# Altium footprint library klp.PcbLib: 436 footprints (part 17 of 28)
Each footprint in its own frame and in the unit in brackets; x right, y up, seen from the top. Pads: shape width x height; smd on the part's side, far side on the other; paste and mask are expansions set on the pad; w line width, h text height; cw(c..) or ccw(c..) is an arc to the next point about the centre after c.
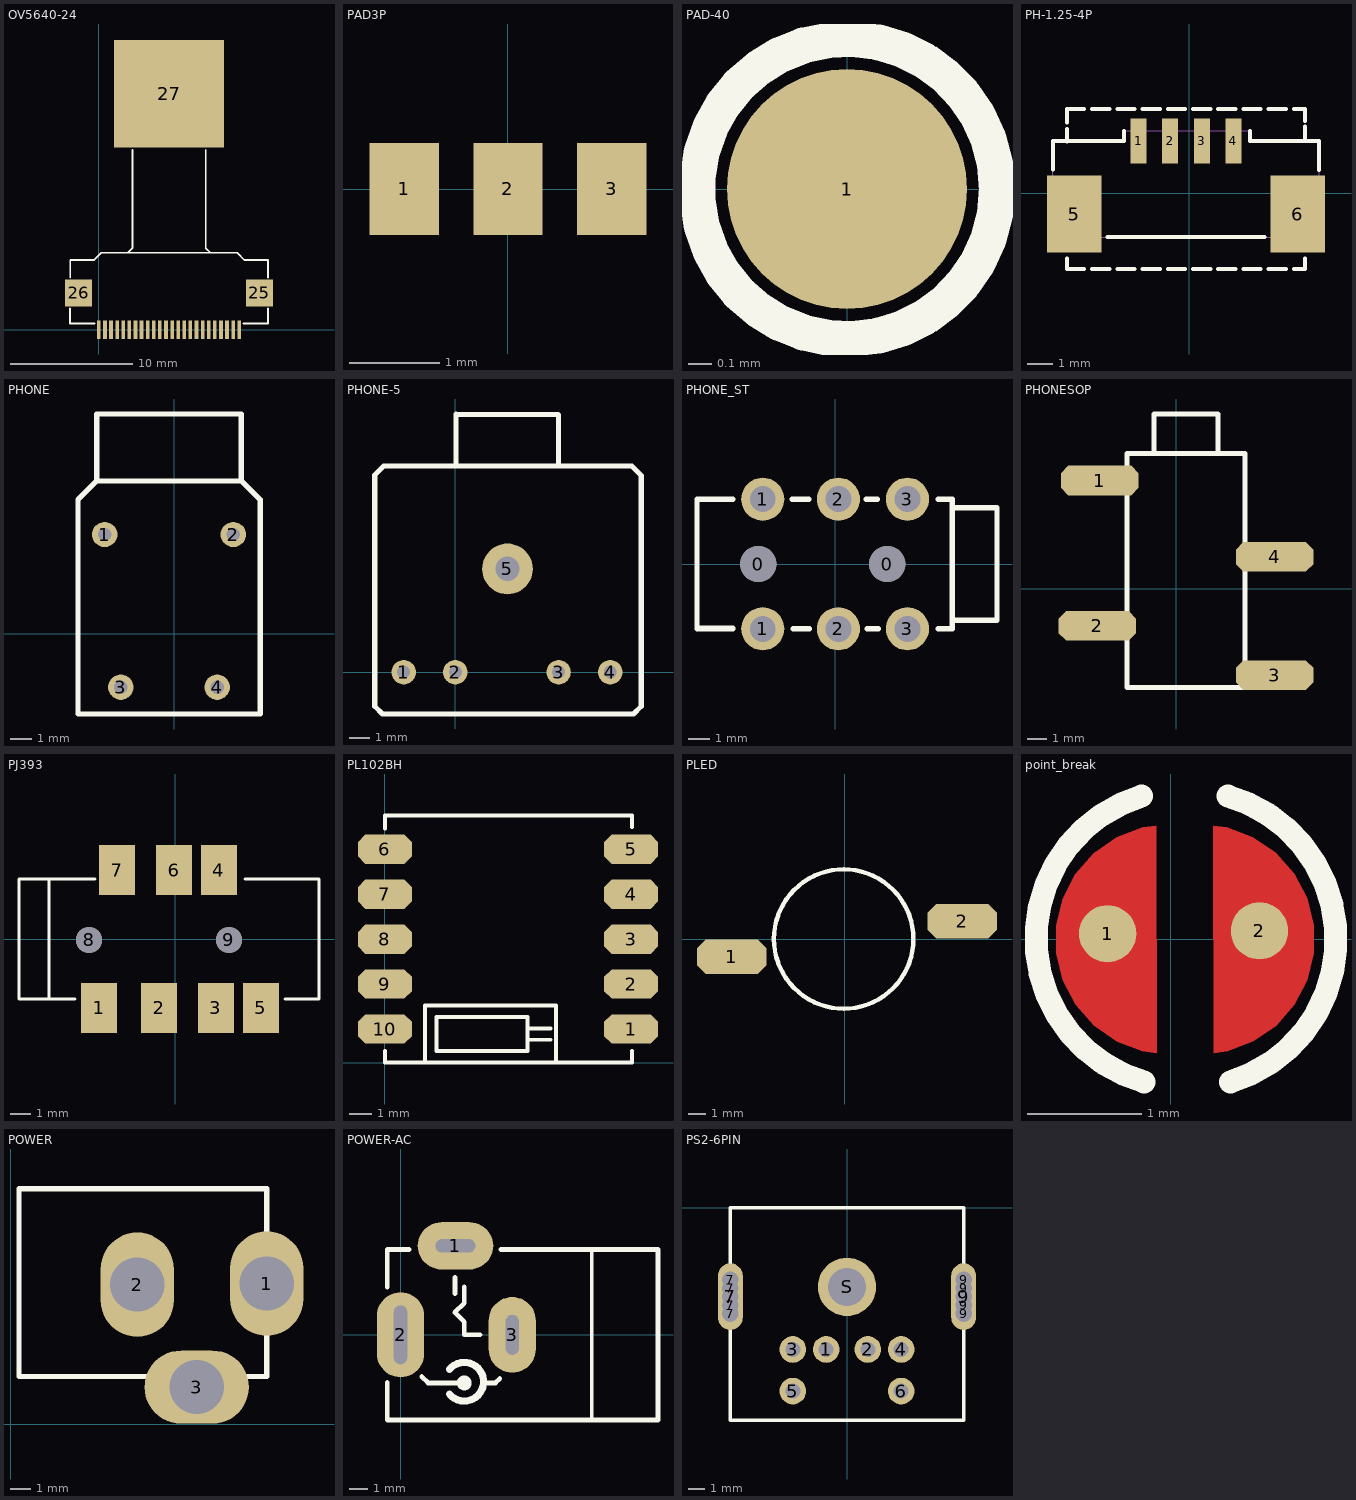
[diagram p16: the footprints below, top view; thin cyan lines are the x and y axes]

## OV5640-24 [mm]
pads (27):
  rect 0.3x1.5 smd: 1(0,0) 2(0.5,0) 3(1,0) 4(1.5,0) 5(2,0) 6(2.5,0) 7(3,0) 8(3.5,0) 9(4,0) 10(4.5,0) 11(5,0) 12(5.5,0) 13(6,0) 14(6.5,0) 15(7,0) 16(7.5,0) 17(8,0) 18(8.5,0) 19(9,0) 20(9.5,0) 21(10,0) 22(10.5,0) 23(11,0) 24(11.5,0)
  rect 2.2x2.2 smd: 25(13.151,3.023) 26(-1.657,3.023)
  rect 9x8.8 smd: 27(5.753,19.317)
Top Overlay:
  lines w0.152: -2.356,1.753 -2.356,0.508 -0.336,0.508 ; -2.343,4.293 -2.343,5.708 ; -2.325,5.708 -0.432,5.708 -0.413,5.708 0.187,6.308 ; 0.33,6.308 0.187,6.308 ; 2.159,6.308 2.371,6.308 2.753,6.69 2.753,14.732 ; 8.753,14.732 8.753,13.424 8.753,6.724 8.753,6.699 9.144,6.308 ; 9.186,6.308 9.271,6.308 ; 11.83,0.508 13.85,0.508 13.85,1.753 ; 13.85,4.293 13.85,5.708 ; 13.85,5.715 13.843,5.708 11.93,5.708 11.33,6.308 0.187,6.308

## PAD3P [mil]
pads (3):
  rect 30x40 smd: 1(-45,0) 2(0,0) 3(45,0)

## PAD-40 [mil]
pads (1):
  round 40 smd paste-43.31: 1(0,0)
Top Overlay:
  circle w6: c0,0 r25

## PCBComponent_1 [mm]

## PH-1.25-4P [mil]
pads (6):
  rect 25x70 smd mask+3: 1(-78.82,82) 2(-29.61,82) 3(19.61,82) 4(68.82,82)
  rect 85x120 smd mask+3: 5(-179.21,-32.17) 6(169.21,-32.17)
Top Overlay:
  lines w6: -212.67,37 -212.67,82 -101.57,82 -101.57,98 ; -191.02,-101.17 -191.02,-118 -163.77,-118 ; -191.02,80.97 -191.02,100.89 ; -191.02,110.58 -191.02,132 -163.77,132 ; -151.65,-118 -124.4,-118 ; -151.65,132 -124.4,132 ; -127.71,-68 117.71,-68 ; -112.28,-118 -85.03,-118 ; -112.28,132 -85.03,132 ; -72.91,-118 -45.66,-118 ; -72.91,132 -45.66,132 ; -33.54,-118 -6.29,-118 ; -33.54,132 -6.29,132 ; 5.83,-118 33.08,-118 ; 5.83,132 33.08,132 ; 45.2,-118 72.45,-118 ; 45.2,132 72.45,132 ; 84.57,-118 111.82,-118 ; 84.57,132 111.82,132 ; 95,98 95,82 202.67,82 202.67,36.83 ; 123.94,-118 151.19,-118 ; 123.94,132 151.19,132 ; 163.31,-118 180.38,-118 ; 163.31,132 180.38,132 ; 181.02,-118 181.02,-101.17 ; 181.02,82 181.02,104.43 ; 181.02,113.2 181.02,132
Mechanical 16:
  lines w1: -212.67,-68 -212.67,82 -101.57,82 -101.57,98 95,98 95,82 202.67,82 202.67,-68 -212.67,-68

## PHONE [mm]
height 0.6
pads (4):
  round 1.2 hole 0.635: 1(-3.302,4.699) 2(2.794,4.699) 3(-2.54,-2.54) 4(2.032,-2.54)
Top Overlay:
  lines w0.254: -3.683,7.239 -3.683,10.414 -0.127,10.414 3.175,10.414 3.175,7.239 ; -3.683,7.239 -4.572,6.35 -4.572,-3.81 4.064,-3.81 4.064,6.35 3.175,7.239 ; -3.683,7.239 3.175,7.239

## PHONE-5 [mm] "PHONE_5"
height 5
pads (5):
  round 1.2 hole 0.635: 1(-2.54,0) 2(0,0) 3(5.08,0) 4(7.62,0)
  round 2.5 hole 1.2: 5(2.565,5.08)
Top Overlay:
  lines w0.254: 0.025,10.135 0.025,12.7 0.051,12.675 5.055,12.675 5.08,12.649 5.08,10.135 ; -3.962,-1.676 -3.581,-2.057 8.763,-2.057 9.144,-1.676 9.144,9.677 8.687,10.135 2.565,10.135 -3.531,10.135 -3.962,9.703 -3.962,-1.676

## PHONE_ST [mm] "PHONE_ST"
height 9
pads (8):
  round 1.676 hole 1.676: 0(-3.556,0) 0(2.413,0)
  round 2 hole 1.2: 1(-3.35,-3) 1(-3.35,3) 2(0.15,-3) 2(0.15,3) 3(3.35,-3) 3(3.35,3)
Top Overlay:
  lines w0.254: -6.393,-2.969 -4.742,-2.969 ; -4.742,-3.007 -6.393,-3.007 -6.393,3 -4.742,3 ; -1.986,3 -1.224,3 ; -1.948,-3.007 -1.186,-3.007 ; 1.443,3 1.951,3 ; 1.481,-3.007 1.989,-3.007 ; 4.783,-3.007 5.33,-3.007 ; 4.783,3 5.418,3 5.418,-3.007 ; 5.418,-2.6 7.493,-2.6 7.493,2.6 5.418,2.6

## PHONESOP [mil]
height 196.85
pads (4):
  oct 157.48x60 smd: 1(-155,220) 2(-160,-75) 3(200,-175) 4(200,65)
Top Overlay:
  lines w10: -45,275 -45,355 85,355 85,275 ; -100,-200 140,-200 140,275 -100,275 -100,-200

## PJ393 [mm]
pads (9):
  rect 1.8x2.5 smd: 1(-3.8,-3.45) 2(-0.8,-3.45) 3(2.05,-3.45) 4(2.2,3.45) 5(4.3,-3.45) 6(-0.05,3.45) 7(-2.9,3.45)
  round 1.3 hole 1.3 unplated: 8(-4.3,-0.05) 9(2.7,-0.05)
Top Overlay:
  lines w0.152: -6.3,-3 -6.3,3 ; -5,-3 -7.8,-3 -7.8,3 -4,3 ; 3.5,3 7.2,3 7.2,-3 5.5,-3

## PL102BH [mm] "PL102BH-2.0"
height 1
pads (10):
  oct 2.4x1.3 smd: 1(10.952,1.492) 2(10.952,3.492) 3(10.952,5.492) 4(10.952,7.492) 5(10.952,9.492) 6(0,9.492) 7(0,7.492) 8(0,5.492) 9(0,3.492) 10(0,1.492)
Top Overlay:
  lines w0.178: 0,0.508 0,0 11,0 11,0.508 ; 0,10.414 0,11 11,11 11,10.492 ; 1.778,0 1.778,2.54 7.62,2.54 7.62,0 ; 6.35,1.016 7.366,1.016 ; 6.35,1.524 7.366,1.524 ; 2.286,0.508 2.286,2.032 6.35,2.032 6.35,0.508 2.286,0.508

## PLED [mm] "POWER LED"
height 5
pads (2):
  oct 4x2 smd: 1(-6.477,-1.016) 2(6.731,1.016)
Top Overlay:
  circle w0.254: c-0.063,0 r4

## point_break [mm]
pads (2):
  round 0.5 smd: 1(-0.55,0.05) 2(0.775,0.075)
Top Layer:
  region: -0.121,-0.992 -0.241,-0.978 -0.468,-0.892 -0.668,-0.754 -0.829,-0.572 -0.942,-0.358 -1,-0.122 -1,0.12 -0.943,0.356 -0.83,0.571 -0.67,0.753 -0.471,0.891 -0.244,0.978 -0.124,0.993
  region: 0.371,0.993 0.491,0.978 0.718,0.892 0.918,0.754 1.079,0.573 1.192,0.358 1.25,0.123 1.25,-0.12 1.193,-0.355 1.08,-0.57 0.92,-0.752 0.721,-0.891 0.494,-0.977 0.374,-0.992
Top Overlay:
  lines w0.2: -0.256,1.25 ccw(c0.125,0.007) -0.232,-1.243 ; 0.5,1.25 cw(c0.143,0) 0.523,-1.243
Top Solder:
  region: -0.121,-0.992 -0.241,-0.978 -0.468,-0.892 -0.668,-0.754 -0.829,-0.572 -0.942,-0.358 -1,-0.122 -1,0.12 -0.943,0.356 -0.83,0.571 -0.67,0.753 -0.471,0.891 -0.244,0.978 -0.124,0.993
  region: 0.371,0.993 0.491,0.978 0.718,0.892 0.918,0.754 1.079,0.573 1.192,0.358 1.25,0.123 1.25,-0.12 1.193,-0.355 1.08,-0.57 0.92,-0.752 0.721,-0.891 0.494,-0.977 0.374,-0.992

## POWER [mil] "DC_IN"
height 472.44
pads (3):
  oval 138x197 hole 102: 1(482.32,265.16) 2(238.32,263.16)
  oval 197x138 hole 102: 3(350.32,70.16)
Top Overlay:
  lines w10: 482.32,90.16 15.32,90.16 15.32,444.16 482.32,444.16 482.32,92.16

## POWER-AC [mm]
pads (3):
  oval 4x2.5 hole 0.7 slot 2.1 at 0 deg: 1(2.9,4.7)
  oval 2.5x4.5 hole 0.7 slot 3.1 at 90 deg: 2(0,0)
  oval 2.5x4 hole 0.7 slot 2.1 at 90 deg: 3(5.9,0)
Top Overlay:
  circle w0.381: c3.36,-2.54 r0.203
  lines w0.203: 10.1,-4.5 10.1,4.5
  lines w0.254: -0.7,-2.515 -0.7,-4.5 13.6,-4.5 13.6,4.5 5.287,4.5 ; -0.7,2.515 -0.7,4.5 0.457,4.5 ; 1.121,-2.206 1.455,-2.54 3.36,-2.54 ; 2.87,2.184 2.87,3.023 ; 3.36,2.54 3.36,1.676 2.865,1.181 3.36,0.686 3.36,0 4.191,0 ; 4.376,-2.54 5.011,-2.54 5.236,-2.315
  lines w0.381: 2.581,-3.134 ccw(c3.363,-2.478) 2.581,-1.822
Mechanical 1:
  lines w0.203: -0.35,-1.55 0.35,-1.55 0.35,1.55 -0.35,1.55 -0.35,-1.55 ; 1.85,4.35 3.95,4.35 3.95,5.05 1.85,5.05 1.85,4.35 ; 5.55,-1.05 5.55,1.05 6.25,1.05 6.25,-1.05 5.55,-1.05
3D body "User Library-dc range - dc connector[4840_2201].STEP": height 11.02, standoff -3.48, extent -0.281,-4.496 13.545,5.01

## PS2-6PIN [mm] "PS2 Socket, 6 Pin, Through Hole"
pads (17):
  round 1.6 hole 0.9: 1(-1.25,-8.5) 2(1.25,-8.5) 3(-3.25,-8.5) 4(3.25,-8.5) 5(-3.25,-11) 6(3.25,-11)
  round 1 hole 1: 7(-7,-6.35) 7(-7,-5.842) 7(-7,-4.826) 7(-7,-4.318) 9(7,-6.35) 9(7,-5.842) 9(7,-4.826) 9(7,-4.318)
  oval 1.5x4 hole 1: 7(-7,-5.334) 9(7,-5.334)
  round 3.5 hole 2.3: S(0,-4.75)
Top Overlay:
  lines w0.2: -7,-12.75 7,-12.75 7,0 -7,0 -7,-12.75